# Altium footprint library FragasLab-Footprint.PcbLib: 360 footprints (part 18 of 23)
Each footprint in its own frame and in the unit in brackets; x right, y up, seen from the top. Pads: shape width x height; smd on the part's side, far side on the other; paste and mask are expansions set on the pad; w line width, h text height; cw(c..) or ccw(c..) is an arc to the next point about the centre after c.
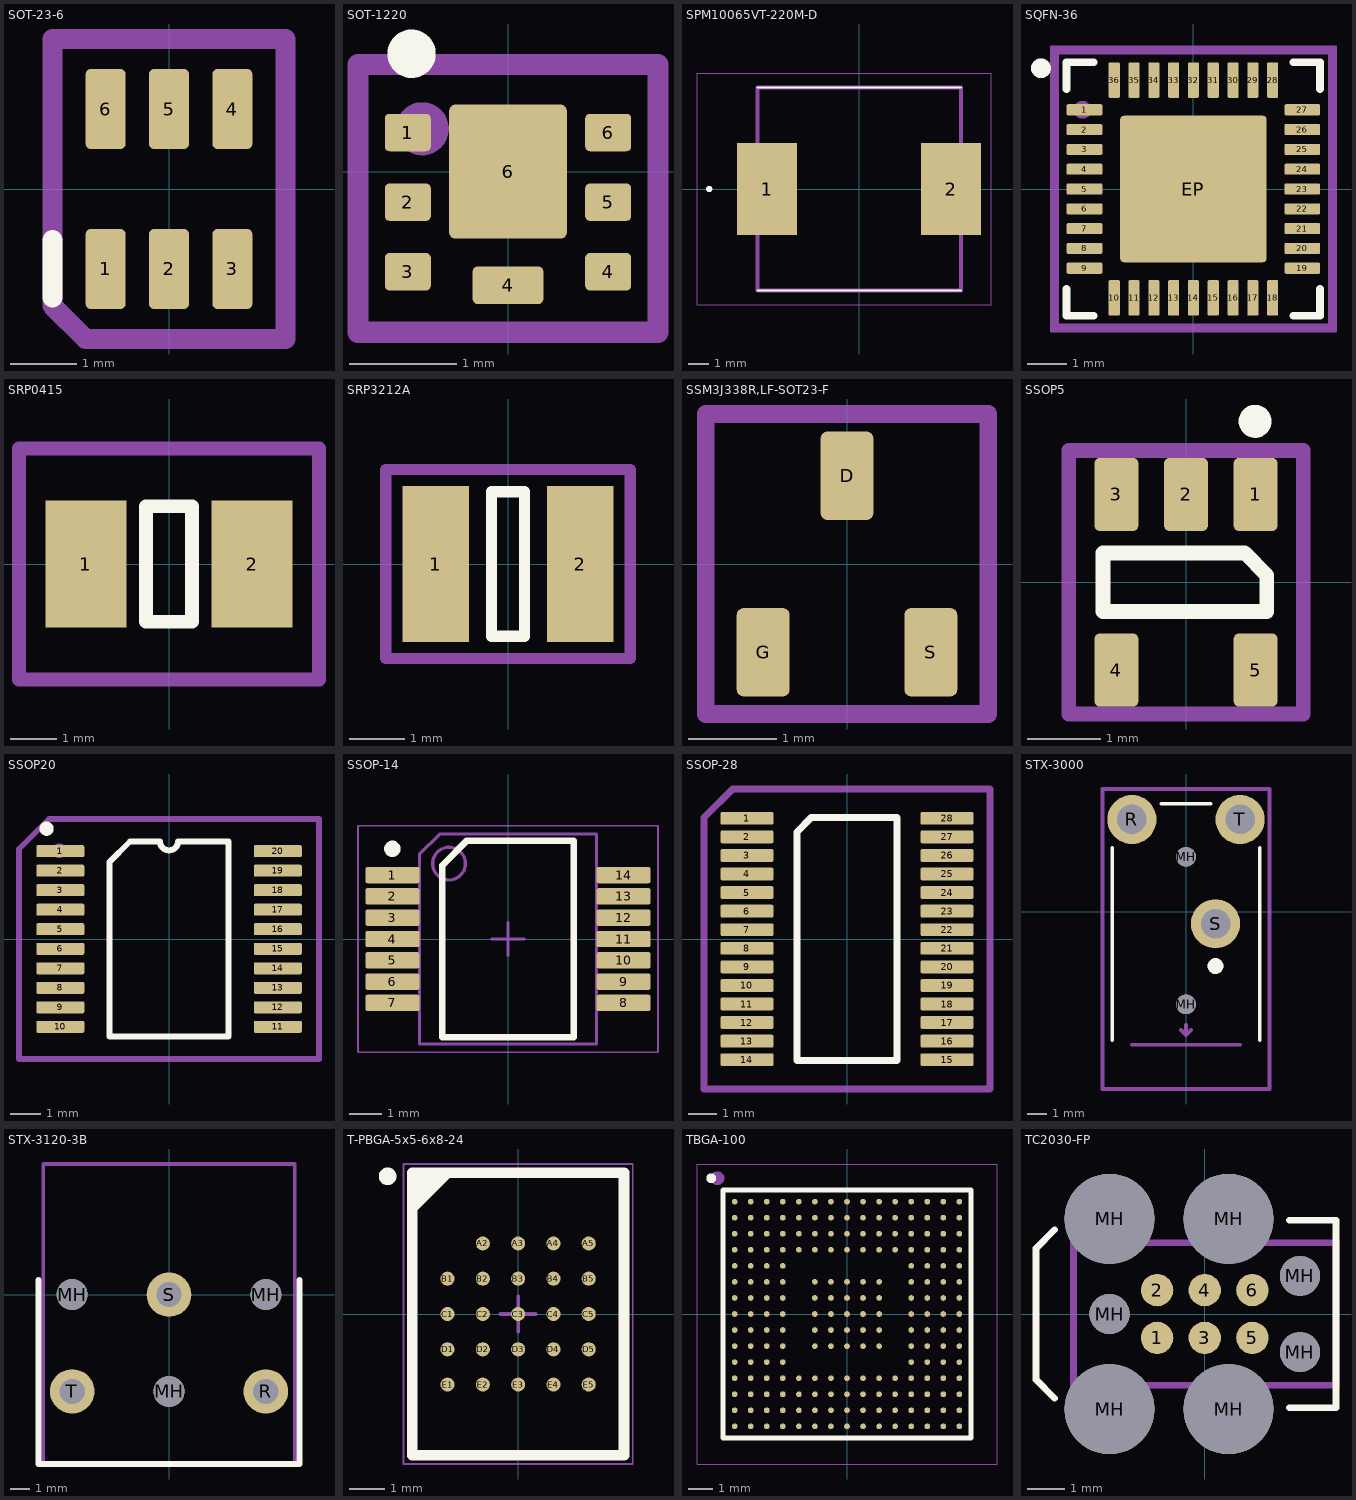
[diagram p17: the footprints below, top view; thin cyan lines are the x and y axes]

## SOT-23-6 [mm]
pads (6):
  rrect25% 0.6x1.2 smd: 1(-0.95,-1.2) 2(0,-1.2) 3(0.95,-1.2) 4(0.95,1.2) 5(0,1.2) 6(-0.95,1.2)
Top Overlay:
  lines w0.3: -1.75,-1.628 -1.75,-0.761
Mechanical 13:
  lines w0.3: -1.75,-1.75 -1.75,0 -1.75,2.25 1.75,2.25 1.75,-2.25 -1.25,-2.25 -1.75,-1.75
  text "'.Designator'" at -5.84,-0.925 h1
3D body "SOT23-6.step": height 1.45, standoff 0, extent -1.45,-1.4 1.45,1.4

## SOT-1220 [mm]
pads (8):
  rrect25% 0.43x0.35 smd mask+0.05: 1(-0.935,0.365) 2(-0.935,-0.285) 3(-0.935,-0.935) 4(0.935,-0.935) 5(0.935,-0.285) 6(0.935,0.365)
  rrect25% 0.66x0.35 smd mask+0.12: 4(0,-1.06)
  rrect10% 1.1x1.25 smd mask+0.18: 6(0,0)
Top Overlay:
  circle w0.3: c-0.9,1.1 r0.075
Mechanical 13:
  circle w0.3: c-0.8,0.4 r0.097
  lines w0.2: -1.4,-1.5 -1.4,1 1.4,1 1.4,-1.5 -1.4,-1.5
  text ".Designator" at -4.998,-0.333 h1
3D body "SOT-1220-UDFN6B.STEP": height 0.61, standoff 0.01, extent -1,-1.287 1,0.713

## SPM10065VT-220M-D [mm]
pads (2):
  rect 2.95x4.5 smd: 1(-4.525,0) 2(4.525,0)
Top Overlay:
  circle w0.2: c-7.375,0 r0.05
  lines w0.1: -5,-5 5,-5 ; -5,5 5,5
Mechanical 13:
  lines w0.2: -5,-5 -5,5 5,5 5,-5 -5,-5
  text "'.Designator'" at -5.84,-0.925 h1
Mechanical 15:
  lines w0.05: -7.975,-5.7 -7.975,5.7 6.5,5.7 6.5,-5.7 -7.975,-5.7
3D body "SPM10065VT-220M-D.stp": height 6.36, standoff 0.01, extent -5.25,-5 5.25,5

## SQFN-36 [mm]
height 1
pads (37):
  rrect25% 0.9x0.28 smd mask+0.05: 1(-2.75,2) 2(-2.75,1.5) 3(-2.75,1) 4(-2.75,0.5) 5(-2.75,0) 6(-2.75,-0.5) 7(-2.75,-1) 8(-2.75,-1.5) 9(-2.75,-2) 19(2.75,-2) 20(2.75,-1.5) 21(2.75,-1) 22(2.75,-0.5) 23(2.75,0) 24(2.75,0.5) 25(2.75,1) 26(2.75,1.5) 27(2.75,2)
  rrect25% 0.28x0.9 smd mask+0.05: 10(-2,-2.75) 11(-1.5,-2.75) 12(-1,-2.75) 13(-0.5,-2.75) 14(0,-2.75) 15(0.5,-2.75) 16(1,-2.75) 17(1.5,-2.75) 18(2,-2.75) 28(2,2.75) 29(1.5,2.75) 30(1,2.75) 31(0.5,2.75) 32(0,2.75) 33(-0.5,2.75) 34(-1,2.75) 35(-1.5,2.75) 36(-2,2.75)
  rrect5% 3.7x3.7 smd: EP(0,0)
Top Overlay:
  circle w0.25: c-3.85,3.05 r0.125
  lines w0.2: -3.2,-2.525 -3.2,-3.2 -2.525,-3.2 ; -3.2,2.525 -3.2,3.2 -2.525,3.2 ; 2.525,-3.2 3.2,-3.2 3.2,-2.525 ; 2.525,3.2 3.2,3.2 3.2,2.525
Mechanical 13:
  circle w0.25: c-2.8,2 r0.1
  lines w0.2: -3.5,-3.5 -3.5,3.5 3.5,3.5 3.5,-3.5 -3.5,-3.5
  text "'.Designator'" at -5.665,-0.417 h1
Mechanical 15:
  lines w0.05: -3.6,-3.6 -3.6,3.6 3.6,3.6 3.6,-3.6 -3.6,-3.6
  lines w0.1: -0.5,0 0.5,0 ; 0,-0.5 0,0.5
3D body "SQFN-36.step": height 1, standoff 0, extent -3.051,-3.051 3.051,3.051

## SRP0415 [mm]
pads (2):
  rect 1.75x2.75 smd: 1(-1.8,0) 2(1.8,0)
Top Overlay:
  lines w0.3: -0.5,-1.25 -0.5,1.25 0.5,1.25 0.5,-1.25 -0.5,-1.25
Mechanical 13:
  lines w0.3: -3.25,-2.5 -3.25,2.5 3.25,2.5 3.25,-2.5 -3.25,-2.5
  text "'.Designator'" at -5.84,-0.925 h1
3D body "SRP0415.stp": height 1.55, standoff 0.05, extent -2.205,-2.05 2.205,2.051

## SRP3212A [mm]
pads (2):
  rect 1.2x2.8 smd: 1(-1.3,0) 2(1.3,0)
Top Overlay:
  lines w0.2: -0.3,-1.3 -0.3,1.3 0.3,1.3 0.3,-1.3 -0.3,-1.3
Mechanical 13:
  lines w0.2: -2.2,-1.7 2.2,-1.7 2.2,1.7 -2.2,1.7 -2.2,-1.7
  text "'.Designator'" at -5.665,-0.417 h1
3D body "SRP3212A.stp": height 1.15, standoff 0.01, extent -1.61,-1.26 1.61,1.26

## SSM3J338R,LF-SOT23-F [mm]
pads (3):
  rrect25% 0.6x1 smd: D(0,1) G(-0.95,-1) S(0.95,-1)
Mechanical 13:
  lines w0.2: -1.6,-1.7 -1.6,1.7 1.6,1.7 1.6,-1.7 -1.6,-1.7
  text "'.Designator'" at -5.84,-0.925 h1
3D body "SOT-23F.STEP": height 0.91, standoff 0, extent -1.45,-1.2 1.45,1.2

## SSOP5 [mm]
pads (5):
  rrect25% 0.6x1 smd: 1(0.95,1.2) 2(0,1.2) 3(-0.95,1.2) 4(-0.95,-1.2) 5(0.95,-1.2)
Top Overlay:
  circle w0.25: c0.944,2.199 r0.1
  lines w0.2: -1.134,-0.4 -1.134,0.4 0.8,0.4 1.104,0.096 1.104,-0.4 -1.134,-0.4
Mechanical 13:
  circle w0.25: c0.962,1.225 r0.1
  lines w0.2: -1.6,-1.8 -1.6,-0.4 -1.6,1.8 1.6,1.8 1.6,-1.8 -1.6,-1.8
  text "'.Designator'" at -5.84,-0.925 h1
3D body "SSOP5.stp": height 1.12, standoff 0, extent -1.45,-1.4 1.45,1.4

## SSOP20 [mm]
pads (20):
  rrect25% 1.6x0.4 smd mask+0.07: 1(-3.625,2.925) 2(-3.625,2.275) 3(-3.625,1.625) 4(-3.625,0.975) 5(-3.625,0.325) 6(-3.625,-0.325) 7(-3.625,-0.975) 8(-3.625,-1.625) 9(-3.625,-2.275) 10(-3.625,-2.925) 11(3.625,-2.925) 12(3.625,-2.275) 13(3.625,-1.625) 14(3.625,-0.975) 15(3.625,-0.325) 16(3.625,0.325) 17(3.625,0.975) 18(3.625,1.625) 19(3.625,2.275) 20(3.625,2.925)
Top Overlay:
  circle w0.25: c-4.079,3.677 r0.112
  lines w0.2: -1.99,-3.25 -1.99,2.56 -1.3,3.25 -0.3,3.25 ccw(c0,3.25) 0.3,3.25 1.99,3.25 1.99,-3.25 -1.99,-3.25
Mechanical 13:
  circle w0.25: c-3.66,2.943 r0.117
  lines w0.2: -5,-4 5,-4 5,4 -4,4 -5,3 -5,-4
  text "'.Designator'" at -5.84,-0.925 h1
3D body "SSOP20.step": height 1.85, standoff 0.01, extent -3.95,-3.63 3.95,3.67

## SSOP-14 [mm]
height 2
pads (14):
  rrect25% 1.65x0.5 smd mask+0.15: 1(-3.525,1.95) 2(-3.525,1.3) 3(-3.525,0.65) 4(-3.525,0) 5(-3.525,-0.65) 6(-3.525,-1.3) 7(-3.525,-1.95) 8(3.525,-1.95) 9(3.525,-1.3) 10(3.525,-0.65) 11(3.525,0) 12(3.525,0.65) 13(3.525,1.3) 14(3.525,1.95)
Top Overlay:
  circle w0.25: c-3.525,2.75 r0.125
  lines w0.2: -2,-3 -2,2.25 -1.25,3 2,3 2,-3 -2,-3
Mechanical 13:
  circle w0.1: c-1.8,2.3 r0.5
  lines w0.1: -2.7,-3.2 -2.7,2.579 -2.079,3.2 2.7,3.2 2.7,-3.2 -2.7,-3.2
  text "'.Designator'" at -6.315,-1.4 h1
Mechanical 15:
  lines w0.05: -4.575,-3.45 4.575,-3.45 4.575,3.45 -4.575,3.45 -4.575,-3.45
  lines w0.1: -0.5,0 0.5,0 ; 0,-0.5 0,0.5
3D body "SSOP-14.step": height 2, standoff 0, extent -3.875,-3.2 3.875,3.2

## SSOP-28 [mm]
pads (28):
  rrect25% 1.85x0.45 smd mask+0.15: 1(-3.5,4.225) 2(-3.5,3.575) 3(-3.5,2.925) 4(-3.5,2.275) 5(-3.5,1.625) 6(-3.5,0.975) 7(-3.5,0.325) 8(-3.5,-0.325) 9(-3.5,-0.975) 10(-3.5,-1.625) 11(-3.5,-2.275) 12(-3.5,-2.925) 13(-3.5,-3.575) 14(-3.5,-4.225) 15(3.5,-4.225) 16(3.5,-3.575) 17(3.5,-2.925) 18(3.5,-2.275) 19(3.5,-1.625) 20(3.5,-0.975) 21(3.5,-0.325) 22(3.5,0.325) 23(3.5,0.975) 24(3.5,1.625) 25(3.5,2.275) 26(3.5,2.925) 27(3.5,3.575) 28(3.5,4.225)
Top Overlay:
  lines w0.25: -1.75,-4.25 1.75,-4.25 1.75,4.25 -1.25,4.25 -1.75,3.75 -1.75,-4.25
Mechanical 13:
  lines w0.25: -5,-5.25 5,-5.25 5,5.25 -4,5.25 -5,4.25 -5,-5.25
  text "'.Designator'" at -5.815,-0.9 h1
3D body "SSOP-28.STEP": height 2.01, standoff 0.01, extent -3.909,-5.108 3.891,5.092

## STX-3000 [mm]
height 5.4
pads (5):
  round 1 hole 1 unplated: MH(0,-4.7) MH(0,2.8)
  round 2.5 hole 1.5: R(-2.75,4.7) S(1.5,-0.6) T(2.75,4.7)
Top Overlay:
  circle w0.5: c1.5,-2.75 r0.15
  lines w0.2: -3.75,-6.5 -3.75,3.25 ; -1.25,5.5 1.25,5.5 ; 3.75,-6.5 3.75,3.25
Mechanical 13:
  circle w0.5: c1.5,-2.75 r0.15
  lines w0.2: -2.75,-6.75 2.75,-6.75 ; -0.25,-6 0,-6.25 ; 0,-5.75 0,-6.25 ; 0.25,-6 0,-6.25 ; -4.25,-9 -4.25,-5 -4.25,6.25 4.25,6.25 4.25,-7.25 4.25,-9 -4.25,-9
  text "'.Designator'" at -5.665,-0.417 h1
3D body "STX-3000.stp": height 5.93, standoff -2.72, extent -3.6,-8.7 3.6,5.266

## STX-3120-3B [mm]
pads (6):
  round 1.6 hole 1.6 unplated: MH(-5,0) MH(0,-5) MH(5,0)
  round 2.3 hole 1.3: R(5,-5) S(0,0) T(-5,-5)
Top Overlay:
  lines w0.3: -6.75,0.75 -6.75,-8.75 6.75,-8.75 6.75,0.75
Mechanical 13:
  lines w0.2: -6.5,-8.75 6.5,-8.75 6.5,6.75 -6.5,6.75 -6.5,-8.75
  text ".Designator" at -4.998,-0.333 h1
3D body "STX-3120-3B.STEP": height 10.22, standoff -3.68, extent -6,-8.6 6,6.5

## T-PBGA-5x5-6x8-24 [mm]
height 1.2
pads (24):
  round 0.4 smd mask+0.05: A2(-1,2) A3(0,2) A4(1,2) A5(2,2) B1(-2,1) B2(-1,1) B3(0,1) B4(1,1) B5(2,1) C1(-2,0) C2(-1,0) C3(0,0) C4(1,0) C5(2,0) D1(-2,-1) D2(-1,-1) D3(0,-1) D4(1,-1) D5(2,-1) E1(-2,-2) E2(-1,-2) E3(0,-2) E4(1,-2) E5(2,-2)
Top Overlay:
  circle w0.25: c-3.7,3.9 r0.125
  region: -2,4 -3,3 -3,4
  lines w0.3: -3,3 -2,4 ; -3,-4 -3,4 3,4 3,-4 -3,-4
Mechanical 13:
  lines w0.1: -3,-4 -3,4 3,4 3,-4 -3,-4
Mechanical 15:
  lines w0.05: -3.25,-4.25 -3.25,4.25 3.25,4.25 3.25,-4.25 -3.25,-4.25
  lines w0.1: -0.5,0 0.5,0 ; 0,-0.5 0,0.5
3D body "T-PBGA-5x5-6x8-24.step": height 1.2, standoff 0, extent -3,-4 3,4

## TBGA-100 [mm]
pads (201):
  round 0.232 smd: A1(-4.55,4.55) A2(-3.9,4.55) A3(-3.25,4.55) A4(-2.6,4.55) A5(-1.95,4.55) A6(-1.3,4.55) A7(-0.65,4.55) A8(0,4.55) A9(0.65,4.55) A10(1.3,4.55) A11(1.95,4.55) A12(2.6,4.55) A13(3.25,4.55) A14(3.9,4.55) A15(4.55,4.55) B1(-4.55,3.9) B2(-3.9,3.9) B3(-3.25,3.9) B4(-2.6,3.9) B5(-1.95,3.9) B6(-1.3,3.9) B7(-0.65,3.9) B8(0,3.9) B9(0.65,3.9) B10(1.3,3.9) B11(1.95,3.9) B12(2.6,3.9) B13(3.25,3.9) B14(3.9,3.9) B15(4.55,3.9) C1(-4.55,3.25) C2(-3.9,3.25) C3(-3.25,3.25) C4(-2.6,3.25) C5(-1.95,3.25) C6(-1.3,3.25) C7(-0.65,3.25) C8(0,3.25) C9(0.65,3.25) C10(1.3,3.25) C11(1.95,3.25) C12(2.6,3.25) C13(3.25,3.25) C14(3.9,3.25) C15(4.55,3.25) D1(-4.55,2.6) D2(-3.9,2.6) D3(-3.25,2.6) D4(-2.6,2.6) D5(-1.95,2.6) D6(-1.3,2.6) D7(-0.65,2.6) D8(0,2.6) D9(0.65,2.6) D10(1.3,2.6) D11(1.95,2.6) D12(2.6,2.6) D13(3.25,2.6) D14(3.9,2.6) D15(4.55,2.6) E1(-4.55,1.95) E2(-3.9,1.95) E3(-3.25,1.95) E4(-2.6,1.95) E12(2.6,1.95) E13(3.25,1.95) E14(3.9,1.95) E15(4.55,1.95) F1(-4.55,1.3) F2(-3.9,1.3) F3(-3.25,1.3) F4(-2.6,1.3) F6(-1.3,1.3) F7(-0.65,1.3) F8(0,1.3) F9(0.65,1.3) F10(1.3,1.3) F12(2.6,1.3) F13(3.25,1.3) F14(3.9,1.3) F15(4.55,1.3) G1(-4.55,0.65) G2(-3.9,0.65) G3(-3.25,0.65) G4(-2.6,0.65) G6(-1.3,0.65) G7(-0.65,0.65) G8(0,0.65) G9(0.65,0.65) G10(1.3,0.65) G12(2.6,0.65) G13(3.25,0.65) G14(3.9,0.65) G15(4.55,0.65) H1(-4.55,0) H2(-3.9,0) H3(-3.25,0) H4(-2.6,0) H6(-1.3,0) H7(-0.65,0) H8(0,0) H9(0.65,0) H10(1.3,0) H12(2.6,0) H13(3.25,0) H14(3.9,0) H15(4.55,0) J1(-4.55,-0.65) J2(-3.9,-0.65) J3(-3.25,-0.65) J4(-2.6,-0.65) J6(-1.3,-0.65) J7(-0.65,-0.65) J8(0,-0.65) J9(0.65,-0.65) J10(1.3,-0.65) J12(2.6,-0.65) J13(3.25,-0.65) J14(3.9,-0.65) J15(4.55,-0.65) K1(-4.55,-1.3) K2(-3.9,-1.3) K3(-3.25,-1.3) K4(-2.6,-1.3) K6(-1.3,-1.3) K7(-0.65,-1.3) K8(0,-1.3) K9(0.65,-1.3) K10(1.3,-1.3) K12(2.6,-1.3) K13(3.25,-1.3) K14(3.9,-1.3) K15(4.55,-1.3) L1(-4.55,-1.95) L2(-3.9,-1.95) L3(-3.25,-1.95) L4(-2.6,-1.95) L12(2.6,-1.95) L13(3.25,-1.95) L14(3.9,-1.95) L15(4.55,-1.95) M1(-4.55,-2.6) M2(-3.9,-2.6) M3(-3.25,-2.6) M4(-2.6,-2.6) M5(-1.95,-2.6) M6(-1.3,-2.6) M7(-0.65,-2.6) M8(0,-2.6) M9(0.65,-2.6) M10(1.3,-2.6) M11(1.95,-2.6) M12(2.6,-2.6) M13(3.25,-2.6) M14(3.9,-2.6) M15(4.55,-2.6) N1(-4.55,-3.25) N2(-3.9,-3.25) N3(-3.25,-3.25) N4(-2.6,-3.25) N5(-1.95,-3.25) N6(-1.3,-3.25) N7(-0.65,-3.25) N8(0,-3.25) N9(0.65,-3.25) N10(1.3,-3.25) N11(1.95,-3.25) N12(2.6,-3.25) N13(3.25,-3.25) N14(3.9,-3.25) N15(4.55,-3.25) P1(-4.55,-3.9) P2(-3.9,-3.9) P3(-3.25,-3.9) P4(-2.6,-3.9) P5(-1.95,-3.9) P6(-1.3,-3.9) P7(-0.65,-3.9) P8(0,-3.9) P9(0.65,-3.9) P10(1.3,-3.9) P11(1.95,-3.9) P12(2.6,-3.9) P13(3.25,-3.9) P14(3.9,-3.9) P15(4.55,-3.9) R1(-4.55,-4.55) R2(-3.9,-4.55) R3(-3.25,-4.55) R4(-2.6,-4.55) R5(-1.95,-4.55) R6(-1.3,-4.55) R7(-0.65,-4.55) R8(0,-4.55) R9(0.65,-4.55) R10(1.3,-4.55) R11(1.95,-4.55) R12(2.6,-4.55) R13(3.25,-4.55) R14(3.9,-4.55) R15(4.55,-4.55)
Top Overlay:
  circle w0.2: c-5.5,5.5 r0.1
  lines w0.2: -5.016,-5.016 -5.016,5.016 5.016,5.016 5.016,-5.016 -5.016,-5.016
Mechanical 13:
  circle w0.5: c-5.25,5.5 r0.031
  lines w0.1: -5,-5 -5,5 5,5 5,-5 -5,-5
  text "'.Designator'" at -5.815,-0.9 h1
Mechanical 15:
  lines w0.05: -6.075,-6.075 -6.075,6.075 6.075,6.075 6.075,-6.075 -6.075,-6.075
3D body "STM32H730IBK6Q.stp": height 0.6, standoff 0, extent -5,-5 5,5

## TC2030-FP [mm]
pads (13):
  round 0.863 smd paste-0.432: 1(-1.27,-0.635) 2(-1.27,0.635) 3(0,-0.635) 4(0,0.635) 5(1.27,-0.635) 6(1.27,0.635)
  round 2.4 hole 2.4 unplated: MH(-2.54,-2.54) MH(-2.54,2.54) MH(0.635,-2.54) MH(0.635,2.54)
  round 1.067 hole 1.067 unplated: MH(-2.54,0) MH(2.54,-1.016) MH(2.54,1.016)
Top Overlay:
  lines w0.175: -4,-2.25 -4.5,-1.75 -4.5,1.75 -4,2.25 ; 2.25,-2.5 3.5,-2.5 3.5,2.5 2.25,2.5
Mechanical 13:
  lines w0.175: -3.5,-1.9 3.5,-1.9 3.5,1.9 -3.5,1.9 -3.5,-1.9
  text "'.Designator'" at -8.633,-0.635 h1.52